# Altium footprint library jointbar.PCBLIB: 166 footprints (part 4 of 11)
Each footprint in its own frame and in the unit in brackets; x right, y up, seen from the top. Pads: shape width x height; smd on the part's side, far side on the other; paste and mask are expansions set on the pad; w line width, h text height; cw(c..) or ccw(c..) is an arc to the next point about the centre after c.
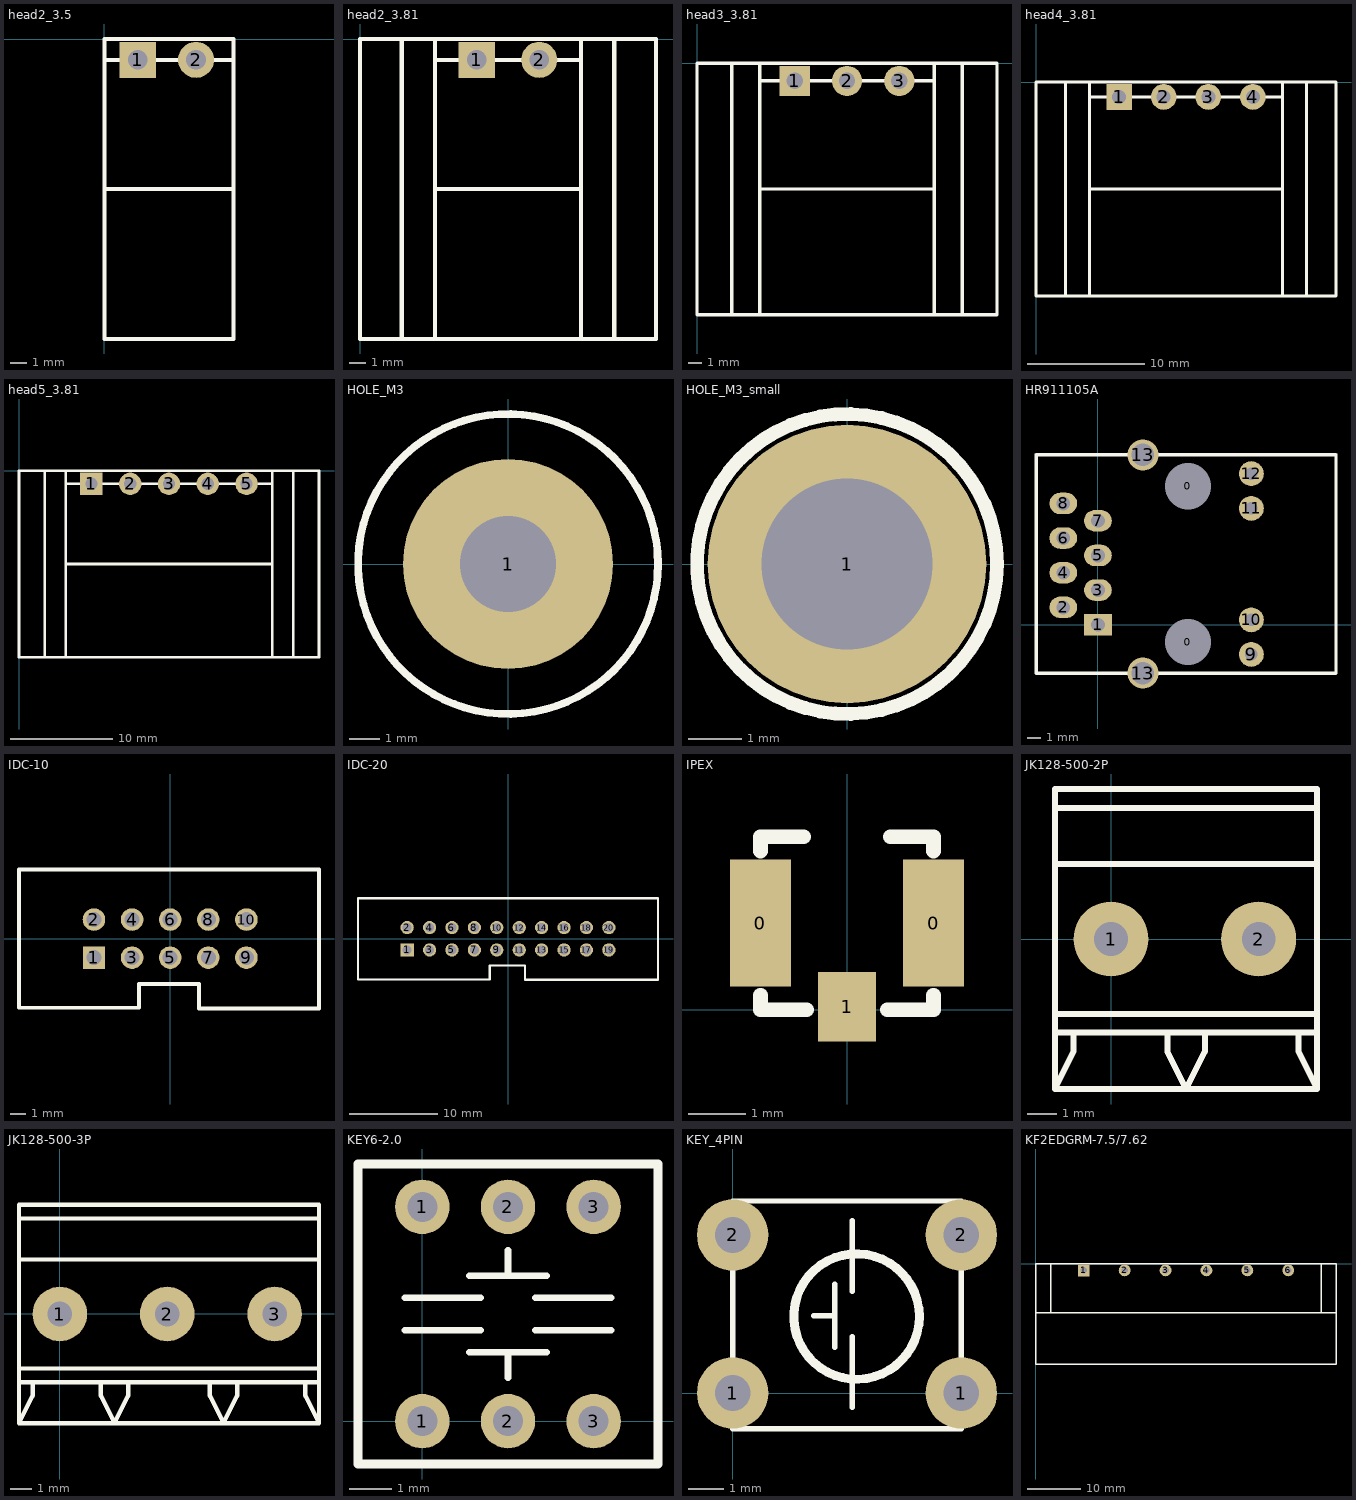
[diagram p3: the footprints below, top view; thin cyan lines are the x and y axes]

## head2_3.5 [mm]
pads (2):
  rect 2.2x2.2 hole 1.2: 1(2.032,-1.27)
  round 2.2 hole 1.2: 2(5.588,-1.27)
TopOverlay:
  lines w0.254: 0,-1.27 7.874,-1.27 ; 0,-9.144 7.874,-9.144 ; 0,-9.144 0,0 7.874,0 7.874,-9.144 ; 0,-9.144 0,-18.288 7.874,-18.288 7.874,-9.144

## head2_3.81 [mm]
pads (2):
  rect 2.2x2.2 hole 1.2: 1(7.112,-1.27)
  round 2.2 hole 1.2: 2(10.922,-1.27)
TopOverlay:
  lines w0.254: 4.572,-5.08 4.572,-9.144 13.462,-9.144 13.462,-5.08 ; 4.572,-1.27 13.462,-1.27 ; 2.54,-18.288 2.54,0 ; 2.54,-18.288 4.572,-18.288 ; 2.54,-18.288 0,-18.288 0,0 2.54,0 ; 2.54,0 4.572,0 ; 4.572,-18.288 13.462,-18.288 ; 4.572,-18.288 4.572,0 ; 4.572,0 13.462,0 ; 13.462,-18.288 13.462,0 ; 13.462,-18.288 15.494,-18.288 ; 13.462,0 15.494,0 ; 15.494,-18.288 18.034,-18.288 18.034,0 15.494,0 ; 15.494,-18.288 15.494,0

## head3_3.81 [mm]
pads (3):
  rect 2.2x2.2 hole 1.2: 1(7.112,-1.27)
  round 2.2 hole 1.2: 2(10.922,-1.27) 3(14.732,-1.27)
TopOverlay:
  lines w0.254: 4.572,-1.27 17.272,-1.27 ; 2.54,-18.288 2.54,0 ; 2.54,-18.288 4.572,-18.288 ; 2.54,-18.288 0,-18.288 0,0 2.54,0 ; 2.54,0 4.572,0 ; 4.572,-18.288 4.572,-9.144 ; 4.572,-18.288 17.272,-18.288 ; 4.572,-9.144 4.572,0 ; 4.572,-9.144 17.272,-9.144 ; 4.572,0 17.272,0 ; 17.272,-18.288 17.272,-9.144 ; 17.272,-18.288 19.304,-18.288 ; 17.272,-9.144 17.272,0 ; 17.272,0 19.304,0 ; 19.304,-18.288 21.844,-18.288 21.844,0 19.304,0 ; 19.304,-18.288 19.304,0

## head4_3.81 [mm]
pads (4):
  rect 2.2x2.2 hole 1.2: 1(7.112,-1.27)
  round 2.2 hole 1.2: 2(10.922,-1.27) 3(14.732,-1.27) 4(18.542,-1.27)
TopOverlay:
  lines w0.254: 4.572,-1.27 21.082,-1.27 ; 2.54,-18.288 0,-18.288 0,0 2.54,0 ; 2.54,-18.288 4.572,-18.288 ; 2.54,-18.288 2.54,0 ; 2.54,0 4.572,0 ; 4.572,-18.288 21.082,-18.288 ; 4.572,-18.288 4.572,-9.144 ; 4.572,-9.144 21.082,-9.144 ; 4.572,-9.144 4.572,0 ; 4.572,0 21.082,0 ; 21.082,-18.288 23.114,-18.288 ; 21.082,-18.288 21.082,-9.144 ; 21.082,-9.144 21.082,0 ; 21.082,0 23.114,0 ; 23.114,-18.288 23.114,0 ; 23.114,-18.288 25.654,-18.288 25.654,0 23.114,0

## head5_3.81 [mm]
pads (5):
  rect 2.2x2.2 hole 1.2: 1(7.112,-1.27)
  round 2.2 hole 1.2: 2(10.922,-1.27) 3(14.732,-1.27) 4(18.542,-1.27) 5(22.352,-1.27)
TopOverlay:
  lines w0.254: 4.572,-1.27 24.892,-1.27 ; 26.67,-18.288 29.464,-18.288 29.464,0 26.924,0 ; 2.54,-18.288 2.54,0 ; 2.54,-18.288 4.572,-18.288 ; 2.54,-18.288 0,-18.288 0,0 2.54,0 ; 2.54,0 4.572,0 ; 4.572,-18.288 24.892,-18.288 ; 4.572,-18.288 4.572,-9.144 ; 4.572,-9.144 4.572,0 ; 4.572,-9.144 24.892,-9.144 ; 4.572,0 24.892,0 ; 24.892,-18.288 24.892,-9.144 ; 24.892,-18.288 26.924,-18.288 26.924,0 ; 24.892,-9.144 24.892,0 ; 24.892,0 26.924,0

## HOLE_M3 [mm]
pads (1):
  round 7 hole 3.2: 1(0,0)
TopOverlay:
  circle w0.254: c0,0 r5

## HOLE_M3_small [mm]
pads (1):
  round 5.2 hole 3.2: 1(0,0)
TopOverlay:
  circle w0.254: c0,0 r2.8

## HR911105A [mil]
pads (16):
  round 39.37 hole 133.86: 0(260,-50) 0(260,400)
  rect 80x62 hole 40: 1(0,0)
  oval 80x62 hole 40: 2(-100,50) 3(0,100) 4(-100,150) 5(0,200) 6(-100,250) 7(0,300) 8(-100,350)
  round 72 hole 36: 9(442.91,-85.63) 10(442.91,14) 11(442.91,335.87) 12(442.91,436)
  round 90 hole 65: 13(129.92,-139.76) 13(129.92,490.16)
TopOverlay:
  lines w10: -178.74,-140 -178.5,-139.76 ; -178.74,490 -178.58,490.16 ; -178.58,490.16 -178.58,-139.69 -178.5,-139.76 ; -178.58,490.16 129.92,490.16 687.24,490.16 687.4,490 687.4,-140 687.17,-139.76 129.92,-139.76 -178.5,-139.76
3D body "User Library-RMS-001L-08A0-GY.STEP": height 90.55, standoff -570.87, extent -153.29,-135.92 685.29,494

## IDC-10 [mm]
pads (10):
  rect 1.499x1.499 hole 1: 1(-5.08,-1.27)
  round 1.5 hole 1: 2(-5.08,1.27) 3(-2.54,-1.27) 4(-2.54,1.27) 5(0,-1.27) 6(0,1.27) 7(2.54,-1.27) 8(2.54,1.27) 9(5.08,-1.27) 10(5.08,1.27)
TopOverlay:
  lines w0.254: -10.08,-4.612 -2.08,-4.612 -2.08,-3.017 1.92,-3.017 1.92,-4.652 9.92,-4.652 9.92,4.598 -10.08,4.598 -10.08,-4.612

## IDC-20 [mm]
pads (20):
  rect 1.499x1.499 hole 1: 1(-11.43,-1.27)
  round 1.5 hole 1: 2(-11.43,1.27) 3(-8.89,-1.27) 4(-8.89,1.27) 5(-6.35,-1.27) 6(-6.35,1.27) 7(-3.81,-1.27) 8(-3.81,1.27) 9(-1.27,-1.27) 10(-1.27,1.27) 12(1.27,1.27) 13(3.81,-1.27) 14(3.81,1.27) 15(6.35,-1.27) 16(6.35,1.27) 17(8.89,-1.27) 18(8.89,1.27) 19(11.43,-1.27) 20(11.43,1.27)
  round 1.499 hole 1: 11(1.27,-1.27)
TopOverlay:
  lines w0.254: -17,-4.612 -2.08,-4.612 -2.08,-3.017 1.92,-3.017 1.92,-4.652 17,-4.652 17,4.598 -17,4.598 -17,-4.612

## IPEX [mm]
pads (3):
  rect 1.05x2.2 smd: 0(-1.5,1.5) 0(1.5,1.5)
  rect 1x1.2 smd: 1(0,0.05)
TopOverlay:
  lines w0.254: -1.5,0.25 -1.5,0 -0.7,0 ; -1.5,2.75 -1.5,3 -0.75,3 ; 0.7,0 1.5,0 1.5,0.25 ; 0.75,3 1.5,3 1.5,2.75
3D body: height 1, standoff 0.5, extent -1,0.524 1,2.524
3D body: height 0.5, standoff 0, extent -1.524,0 1.524,3.048

## JK128-500-2P [mil]
pads (2):
  round 100 hole 45: 1(0,0) 2(196.85,0)
TopOverlay:
  lines w8: -75,-125 275,-125 ; -75,-100 275,-100 ; -75,100 275,100 ; -75,175 275,175 ; -50,-125 -50,-150 -75,-200 ; 75,-125 75,-150 100,-200 125,-150 125,-125 ; 250,-125 250,-150 275,-200 ; -75,-200 -75,200 275,200 275,-200 ; -75,-200 275,-200

## JK128-500-3P [mil]
pads (3):
  round 100 hole 45: 1(0,-0.02) 2(196.85,-0.02) 3(393.7,-0.02)
TopOverlay:
  lines w8: -75,-125.02 225,-125.02 275,-125.02 275,-150.02 300,-200.02 325,-150.02 325,-125.02 ; -75,99.98 225,99.98 275,99.98 ; -75,174.98 225,174.98 275,174.98 ; -50,-125.02 -50,-150.02 -75,-200.02 ; 75,-125.02 75,-150.02 100,-200.02 125,-150.02 125,-125.02 425,-125.02 475,-125.02 ; 125,-200.02 425,-200.02 475,-200.02 ; 125,-100.02 425,-100.02 475,-100.02 ; 125,99.98 425,99.98 475,99.98 ; 125,174.98 425,174.98 475,174.98 ; 125,199.98 425,199.98 475,199.98 475,149.98 475,-150.02 475,-200.02 ; 275,-200.02 225,-200.02 -75,-200.02 ; 275,-100.02 225,-100.02 -75,-100.02 ; 275,199.98 225,199.98 -75,199.98 -75,-100.02 ; 450,-125.02 450,-150.02 475,-200.02 ; -75,-200.02 -75,-100.02

## KEY6-2.0 [mm] "方形,7x7mm,6pin/2.0mm间距"
pads (6):
  round 1.27 hole 0.7: 1(0,0) 1(0,5) 2(2,0) 2(2,5) 3(4,0) 3(4,5)
TopOverlay:
  lines w0.152: -0.413,2.119 1.365,2.119 ; -0.413,2.881 1.365,2.881 ; 1.1,1.611 2.9,1.611 ; 1.1,3.389 2.9,3.389 ; 2,1.011 2,1.611 ; 2,3.389 2,3.989 ; 2.635,2.119 4.413,2.119 ; 2.635,2.881 4.413,2.881
  lines w0.203: -1.5,-1 5.5,-1 5.5,6 -1.5,6 -1.5,-1

## KEY_4PIN [mil]
pads (4):
  round 80 hole 40: 1(0,0) 1(256,0) 2(0,177) 2(256,177)
TopOverlay:
  circle w10: c138.74,85.67 r70.27
  lines w6: 90.55,86.61 114.17,86.61 ; 114.17,51.18 114.17,122.05 ; 133.86,-15.75 133.86,62.99 ; 133.86,114.17 133.86,192.91 ; 0,-40 256,-40 256,215 0,215 0,-40

## KF2EDGRM-7.5/7.62 [mm]
pads (6):
  rect 2.2x2.2 hole 1.2: 1(8.89,-1.27)
  round 2.2 hole 1.2: 2(16.51,-1.27) 3(24.13,-1.27) 4(31.75,-1.27) 5(39.37,-1.27) 6(46.99,-1.27)
TopOverlay:
  lines w0.254: 2.794,-9.144 2.794,0 ; 53.086,-9.144 53.086,0 ; 0,-9.144 55.88,-9.144 ; 0,-9.144 0,0 55.88,0 55.88,-9.144 ; 0,-9.144 0,-18.796 55.88,-18.796 55.88,-9.144